# Altium footprint library lib_datalogger.PcbLib: 866 footprints (part 27 of 55)
Each footprint in its own frame and in the unit in brackets; x right, y up, seen from the top. Pads: shape width x height; smd on the part's side, far side on the other; paste and mask are expansions set on the pad; w line width, h text height; cw(c..) or ccw(c..) is an arc to the next point about the centre after c.
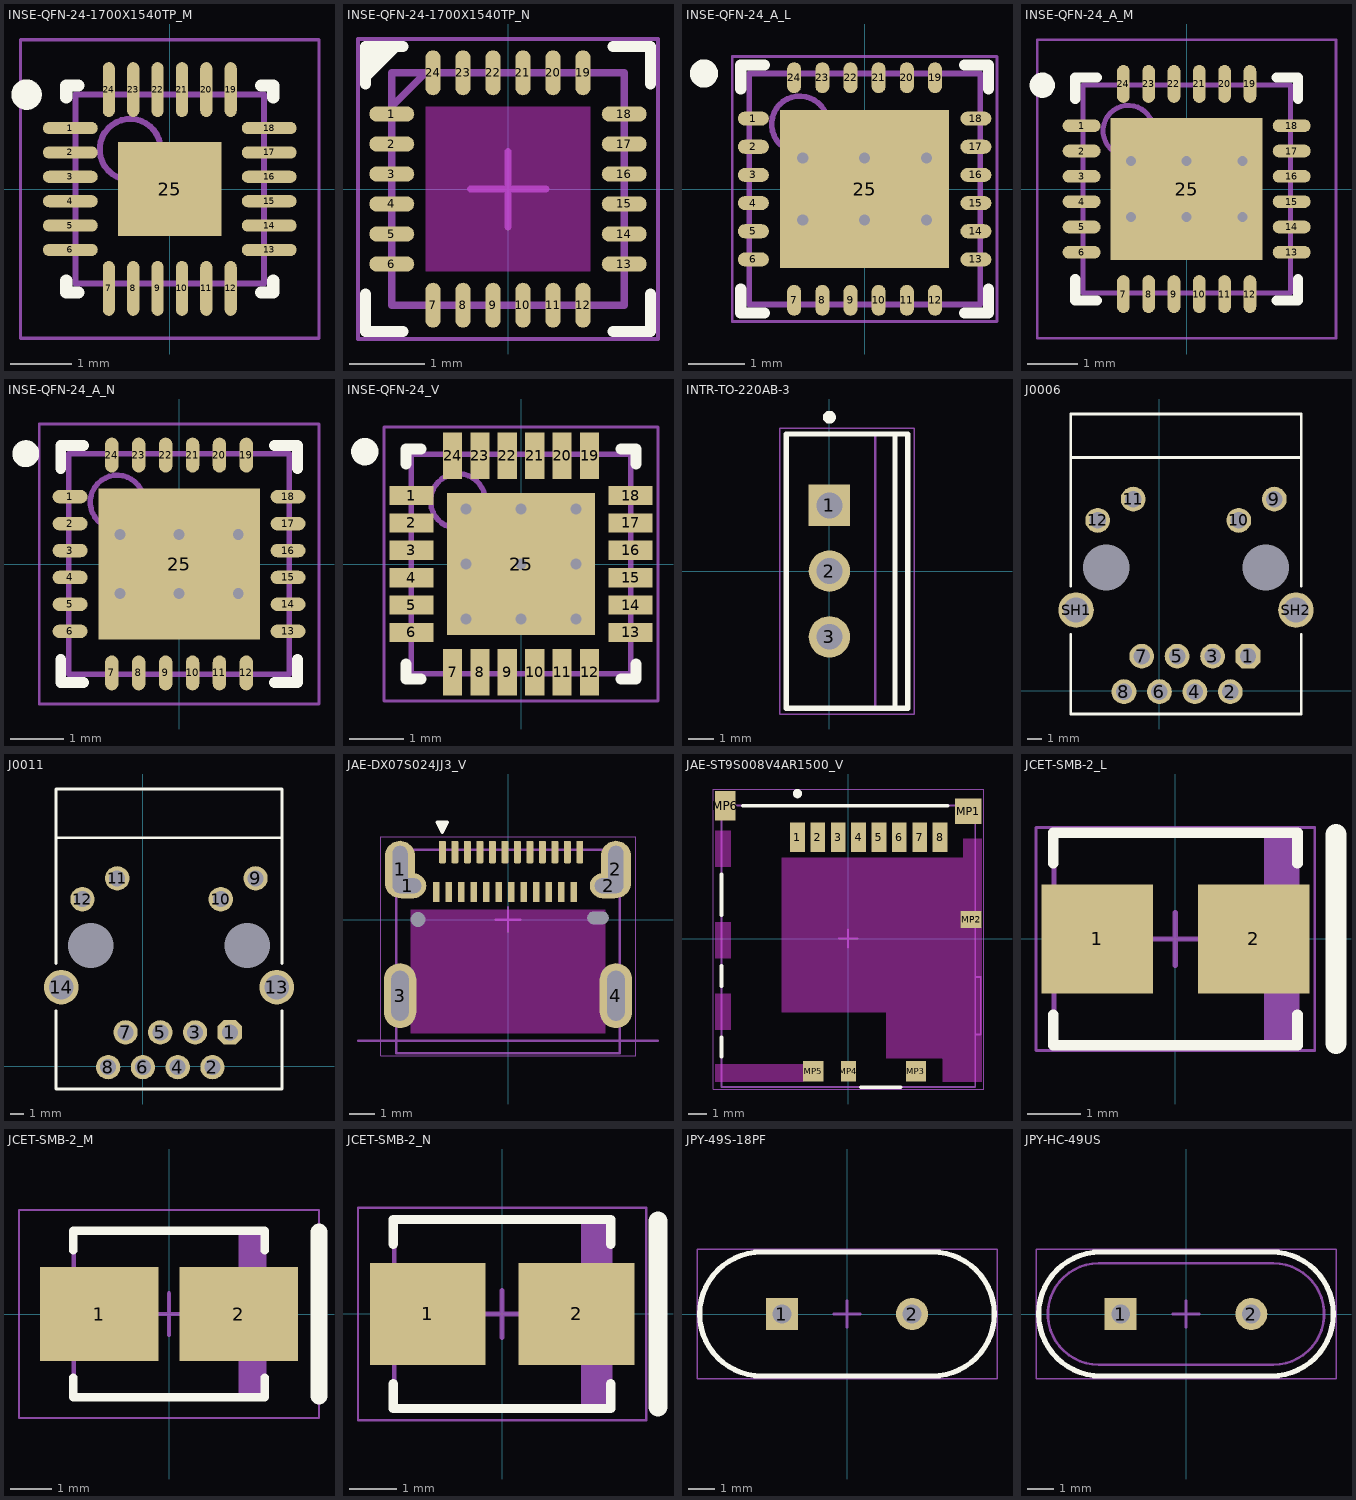
[diagram p26: the footprints below, top view; thin cyan lines are the x and y axes]

## INSE-QFN-24-1700X1540TP_M [mm] "QFN, 24-Leads, Body 3.1x3.1mm, Pitch 0.40mm, Thermal Pad 1.54x1.70mm, IPC Low Density"
height 1.05
pads (25):
  oval 0.9x0.2 smd: 1(-1.632,1) 2(-1.632,0.6) 3(-1.632,0.2) 4(-1.632,-0.2) 5(-1.632,-0.6) 6(-1.632,-1) 13(1.632,-1) 14(1.632,-0.6) 15(1.632,-0.2) 16(1.632,0.2) 17(1.632,0.6) 18(1.632,1)
  oval 0.2x0.9 smd: 7(-1,-1.632) 8(-0.6,-1.632) 9(-0.2,-1.632) 10(0.2,-1.632) 11(0.6,-1.632) 12(1,-1.632) 19(1,1.632) 20(0.6,1.632) 21(0.2,1.632) 22(-0.2,1.632) 23(-0.6,1.632) 24(-1,1.632)
  rect 1.7x1.54 smd: 25(0,0)
Top Overlay:
  circle w0.25: c-2.35,1.55 r0.125
  lines w0.2: -1.7,-1.5 -1.7,-1.7 -1.5,-1.7 ; -1.7,1.5 -1.7,1.7 -1.5,1.7 ; 1.5,-1.7 1.7,-1.7 1.7,-1.5 ; 1.5,1.7 1.7,1.7 1.7,1.5
Mechanical 13:
  circle w0.1: c-0.65,0.65 r0.5
  lines w0.1: -1.55,-1.55 1.55,-1.55 1.55,1.55 -1.55,1.55 -1.55,-1.55
Mechanical 15:
  lines w0.05: -2.45,-2.45 2.45,-2.45 2.45,2.45 -2.45,2.45 -2.45,-2.45
  lines w0.1: -0.5,0 0.5,0 ; 0,-0.5 0,0.5
3D body "QFN40P300X300X105_HS-25L.step": height 1.05, standoff 0, extent -1.551,-1.551 1.551,1.551

## INSE-QFN-24-1700X1540TP_N [mm] "QFN, 24-Leads, Body 3.1x3.1mm, Pitch 0.40mm, Thermal Pad 1.54x1.70mm, IPC Medium Density"
height 1.05
pads (24):
  oval 0.6x0.2 smd: 1(-1.55,1) 2(-1.55,0.6) 3(-1.55,0.2) 4(-1.55,-0.2) 5(-1.55,-0.6) 6(-1.55,-1) 13(1.55,-1) 14(1.55,-0.6) 15(1.55,-0.2) 16(1.55,0.2) 17(1.55,0.6) 18(1.55,1)
  oval 0.2x0.6 smd: 7(-1,-1.55) 8(-0.6,-1.55) 9(-0.2,-1.55) 10(0.2,-1.55) 11(0.6,-1.55) 12(1,-1.55) 19(1,1.55) 20(0.6,1.55) 21(0.2,1.55) 22(-0.2,1.55) 23(-0.6,1.55) 24(-1,1.55)
Top Overlay:
  region: -1.9,1.9 -1.9,1.5 -1.5,1.9
  lines w0.15: -1.9,-1.4 -1.9,-1.9 -1.4,-1.9 ; -1.9,1.4 -1.9,1.9 -1.4,1.9 ; -1.9,1.5 -1.5,1.9 ; 1.4,-1.9 1.9,-1.9 1.9,-1.4 ; 1.4,1.9 1.9,1.9 1.9,1.4
Keep-Out Layer:
  rectangle: -1.1,-1.1 1.1,1.1
Mechanical 13:
  lines w0.1: -1.55,1.1 -1.1,1.55 ; -1.55,-1.55 -1.55,1.55 1.55,1.55 1.55,-1.55 -1.55,-1.55
Mechanical 15:
  lines w0.05: -2,-2 -2,2 2,2 2,-2 -2,-2
  lines w0.1: -0.5,0 0.5,0 ; 0,-0.5 0,0.5
Top Designator:
  text ".Designator" at -1.27,-0.127 h0.6
3D body "MPU9250.STEP": height 1.04, standoff -0.01, extent -1.51,-1.51 1.51,1.51

## INSE-QFN-24_A_L [mm] "QFN, 24-Leads, Body 4.1x4.1mm, Pitch 0.50mm, Thermal Pad 3.00x2.80mm, IPC High Density"
height 0.95
pads (25):
  oval 0.55x0.25 smd: 1(-1.975,1.25) 2(-1.975,0.75) 3(-1.975,0.25) 4(-1.975,-0.25) 5(-1.975,-0.75) 6(-1.975,-1.25) 13(1.975,-1.25) 14(1.975,-0.75) 15(1.975,-0.25) 16(1.975,0.25) 17(1.975,0.75) 18(1.975,1.25)
  oval 0.25x0.55 smd: 7(-1.25,-1.975) 8(-0.75,-1.975) 9(-0.25,-1.975) 10(0.25,-1.975) 11(0.75,-1.975) 12(1.25,-1.975) 19(1.25,1.975) 20(0.75,1.975) 21(0.25,1.975) 22(-0.25,1.975) 23(-0.75,1.975) 24(-1.25,1.975)
  rect 3x2.8 smd: 25(0,0)
via -1.1,0.55 diameter 0.5 hole 0.2
via 0,0.55 diameter 0.5 hole 0.2
via 1.1,0.55 diameter 0.5 hole 0.2
via -1.1,-0.55 diameter 0.5 hole 0.2
via 0,-0.55 diameter 0.5 hole 0.2
via 1.1,-0.55 diameter 0.5 hole 0.2
Top Overlay:
  circle w0.25: c-2.85,2.05 r0.125
  lines w0.2: -2.2,-1.775 -2.2,-2.2 -1.775,-2.2 ; -2.2,1.775 -2.2,2.2 -1.775,2.2 ; 1.775,-2.2 2.2,-2.2 2.2,-1.775 ; 1.775,2.2 2.2,2.2 2.2,1.775
Mechanical 13:
  circle w0.1: c-1.15,1.15 r0.5
  lines w0.1: -2.05,-2.05 -2.05,2.05 2.05,2.05 2.05,-2.05 -2.05,-2.05
Mechanical 15:
  lines w0.05: -2.35,-2.35 -2.35,2.35 2.35,2.35 2.35,-2.35 -2.35,-2.35
  lines w0.1: -0.5,0 0.5,0 ; 0,-0.5 0,0.5
3D body "QFN50P400X400X95_HS-25L.step": height 0.95, standoff 0, extent -2.051,-2.051 2.051,2.051

## INSE-QFN-24_A_M [mm] "QFN, 24-Leads, Body 4.1x4.1mm, Pitch 0.50mm, Thermal Pad 3.00x2.80mm, IPC Low Density"
height 0.95
pads (25):
  oval 0.75x0.25 smd: 1(-2.075,1.25) 2(-2.075,0.75) 3(-2.075,0.25) 4(-2.075,-0.25) 5(-2.075,-0.75) 6(-2.075,-1.25) 13(2.075,-1.25) 14(2.075,-0.75) 15(2.075,-0.25) 16(2.075,0.25) 17(2.075,0.75) 18(2.075,1.25)
  oval 0.25x0.75 smd: 7(-1.25,-2.075) 8(-0.75,-2.075) 9(-0.25,-2.075) 10(0.25,-2.075) 11(0.75,-2.075) 12(1.25,-2.075) 19(1.25,2.075) 20(0.75,2.075) 21(0.25,2.075) 22(-0.25,2.075) 23(-0.75,2.075) 24(-1.25,2.075)
  rect 3x2.8 smd: 25(0,0)
via 1.1,-0.55 diameter 0.5 hole 0.2
via 0,-0.55 diameter 0.5 hole 0.2
via -1.1,-0.55 diameter 0.5 hole 0.2
via 1.1,0.55 diameter 0.5 hole 0.2
via 0,0.55 diameter 0.5 hole 0.2
via -1.1,0.55 diameter 0.5 hole 0.2
Top Overlay:
  circle w0.25: c-2.85,2.05 r0.125
  lines w0.2: -2.2,-1.775 -2.2,-2.2 -1.775,-2.2 ; -2.2,1.775 -2.2,2.2 -1.775,2.2 ; 1.775,-2.2 2.2,-2.2 2.2,-1.775 ; 1.775,2.2 2.2,2.2 2.2,1.775
Mechanical 13:
  circle w0.1: c-1.15,1.15 r0.5
  lines w0.1: -2.05,-2.05 2.05,-2.05 2.05,2.05 -2.05,2.05 -2.05,-2.05
Mechanical 15:
  lines w0.05: -2.95,-2.95 2.95,-2.95 2.95,2.95 -2.95,2.95 -2.95,-2.95
  lines w0.1: -0.5,0 0.5,0 ; 0,-0.5 0,0.5
3D body "QFN50P400X400X95_HS-25M.step": height 0.95, standoff 0, extent -2.051,-2.051 2.051,2.051

## INSE-QFN-24_A_N [mm] "QFN, 24-Leads, Body 4.1x4.1mm, Pitch 0.50mm, Thermal Pad 3.00x2.80mm, IPC Medium Density"
height 0.95
pads (25):
  oval 0.65x0.25 smd: 1(-2.025,1.25) 2(-2.025,0.75) 3(-2.025,0.25) 4(-2.025,-0.25) 5(-2.025,-0.75) 6(-2.025,-1.25) 13(2.025,-1.25) 14(2.025,-0.75) 15(2.025,-0.25) 16(2.025,0.25) 17(2.025,0.75) 18(2.025,1.25)
  oval 0.25x0.65 smd: 7(-1.25,-2.025) 8(-0.75,-2.025) 9(-0.25,-2.025) 10(0.25,-2.025) 11(0.75,-2.025) 12(1.25,-2.025) 19(1.25,2.025) 20(0.75,2.025) 21(0.25,2.025) 22(-0.25,2.025) 23(-0.75,2.025) 24(-1.25,2.025)
  rect 3x2.8 smd: 25(0,0)
via 1.1,-0.55 diameter 0.5 hole 0.2
via 0,-0.55 diameter 0.5 hole 0.2
via -1.1,-0.55 diameter 0.5 hole 0.2
via 1.1,0.55 diameter 0.5 hole 0.2
via 0,0.55 diameter 0.5 hole 0.2
via -1.1,0.55 diameter 0.5 hole 0.2
Top Overlay:
  circle w0.25: c-2.85,2.05 r0.125
  lines w0.2: -2.2,-1.775 -2.2,-2.2 -1.775,-2.2 ; -2.2,1.775 -2.2,2.2 -1.775,2.2 ; 1.775,-2.2 2.2,-2.2 2.2,-1.775 ; 1.775,2.2 2.2,2.2 2.2,1.775
Mechanical 13:
  circle w0.1: c-1.15,1.15 r0.5
  lines w0.1: -2.05,-2.05 2.05,-2.05 2.05,2.05 -2.05,2.05 -2.05,-2.05
Mechanical 15:
  lines w0.05: -2.6,-2.6 2.6,-2.6 2.6,2.6 -2.6,2.6 -2.6,-2.6
  lines w0.1: -0.5,0 0.5,0 ; 0,-0.5 0,0.5
3D body "QFN50P400X400X95_HS-25N.step": height 0.95, standoff 0, extent -2.051,-2.051 2.051,2.051

## INSE-QFN-24_V [mm] "QFN, 24-Leads, Body 4.00x4.00mm, Pitch 0.50mm, Thermal Pad 2.7x2.6mm"
height 0.95
pads (25):
  rect 0.8x0.35 smd: 1(-2,1.25) 2(-2,0.75) 3(-2,0.25) 4(-2,-0.25) 5(-2,-0.75) 6(-2,-1.25) 13(2,-1.25) 14(2,-0.75) 15(2,-0.25) 16(2,0.25) 17(2,0.75) 18(2,1.25)
  rect 0.35x0.85 smd: 7(-1.25,-1.975) 8(-0.75,-1.975) 9(-0.25,-1.975) 10(0.25,-1.975) 11(0.75,-1.975) 12(1.25,-1.975) 19(1.25,1.975) 20(0.75,1.975) 21(0.25,1.975) 22(-0.25,1.975) 23(-0.75,1.975) 24(-1.25,1.975)
  rect 2.7x2.6 smd: 25(0,0)
via -1,1 diameter 0.5 hole 0.2
via 0,1 diameter 0.5 hole 0.2
via 1,1 diameter 0.5 hole 0.2
via -1,0 diameter 0.5 hole 0.2
via 0,0 diameter 0.5 hole 0.2
via 1,0 diameter 0.5 hole 0.2
via -1,-1 diameter 0.5 hole 0.2
via 0,-1 diameter 0.5 hole 0.2
via 1,-1 diameter 0.5 hole 0.2
Top Overlay:
  circle w0.25: c-2.85,2.05 r0.125
  lines w0.2: -2.1,-1.825 -2.1,-2.1 -1.825,-2.1 ; -2.1,1.825 -2.1,2.1 -1.825,2.1 ; 1.825,-2.1 2.1,-2.1 2.1,-1.825 ; 1.825,2.1 2.1,2.1 2.1,1.825
Mechanical 13:
  circle w0.1: c-1.15,1.15 r0.5
  lines w0.1: -2,-2 -2,2 2,2 2,-2 -2,-2
Mechanical 15:
  lines w0.05: -2.5,-2.5 2.5,-2.5 2.5,2.5 -2.5,2.5 -2.5,-2.5
  lines w0.1: -0.5,0 0.5,0 ; 0,-0.5 0,0.5
3D body: height 0.95, standoff 0, extent -2,-2 2,2

## INTR-TO-220AB-3 [mm] "FM, 3-Leads, Body 10.55x4.7mm, Pitch 2.54mm"
height 19.3
pads (3):
  rect 1.6x1.6 hole 1: 1(0,2.54)
  round 1.6 hole 1: 2(0,0) 3(0,-2.54)
Top Overlay:
  circle w0.25: c0,5.95 r0.125
  lines w0.2: 2.53,-5.3 2.53,5.3 ; -1.67,-5.3 3.03,-5.3 3.03,5.3 -1.67,5.3 -1.67,-5.3
Mechanical 13:
  lines w0.1: 1.78,-5.275 1.78,5.275 ; -1.67,-5.275 -1.67,5.275 3.03,5.275 3.03,-5.275 -1.67,-5.275
Mechanical 15:
  lines w0.05: -1.92,-5.525 -1.92,5.525 3.28,5.525 3.28,-5.525 -1.92,-5.525
  lines w0.1: -0.5,0 0.5,0 ; 0,-0.5 0,0.5
3D body: height 3.55, standoff 0, extent -0.255,1.9 0.255,3.18
3D body: height 0, standoff -1.6, extent -0.255,2.135 0.255,2.945
3D body: height 3.55, standoff 0, extent -0.255,-0.64 0.255,0.64
3D body: height 0, standoff -1.6, extent -0.255,-0.405 0.255,0.405
3D body: height 3.55, standoff 0, extent -0.255,-3.18 0.255,-1.9
3D body: height 0, standoff -1.6, extent -0.255,-2.945 0.255,-2.135
3D body: height 13, standoff 3.55, extent -1.67,-5.275 3.03,5.275
3D body: height 14.73, standoff 13, extent 1.78,-5.2 3.03,5.2
3D body: height 14.77, standoff 14.73, extent 1.78,0.356 3.03,5.2
3D body: height 14.77, standoff 14.73, extent 1.78,-5.2 3.03,-0.356
3D body: height 18.38, standoff 18.34, extent 1.78,0.356 3.03,5.2
3D body: height 18.38, standoff 18.34, extent 1.78,-5.2 3.03,-0.356
3D body: height 14.87, standoff 14.76, extent 1.78,0.698 3.03,5.2
3D body: height 14.87, standoff 14.76, extent 1.78,-5.2 3.03,-0.698
3D body: height 18.34, standoff 18.24, extent 1.78,0.698 3.03,5.2
3D body: height 18.34, standoff 18.24, extent 1.78,-5.2 3.03,-0.698
3D body: height 15.04, standoff 14.86, extent 1.78,1.014 3.03,5.2
3D body: height 15.04, standoff 14.86, extent 1.78,-5.2 3.03,-1.014
3D body: height 18.24, standoff 18.07, extent 1.78,1.014 3.03,5.2
3D body: height 18.24, standoff 18.07, extent 1.78,-5.2 3.03,-1.014
3D body: height 15.26, standoff 15.03, extent 1.78,1.29 3.03,5.2
3D body: height 15.26, standoff 15.03, extent 1.78,-5.2 3.03,-1.29
3D body: height 18.07, standoff 17.84, extent 1.78,1.29 3.03,5.2
3D body: height 18.07, standoff 17.84, extent 1.78,-5.2 3.03,-1.29
3D body: height 15.54, standoff 15.26, extent 1.78,1.517 3.03,5.2
3D body: height 15.54, standoff 15.26, extent 1.78,-5.2 3.03,-1.517
3D body: height 17.85, standoff 17.56, extent 1.78,1.517 3.03,5.2
3D body: height 17.85, standoff 17.56, extent 1.78,-5.2 3.03,-1.517
3D body: height 15.86, standoff 15.54, extent 1.78,1.686 3.03,5.2
3D body: height 15.86, standoff 15.54, extent 1.78,-5.2 3.03,-1.686
3D body: height 17.57, standoff 17.25, extent 1.78,1.686 3.03,5.2
3D body: height 17.57, standoff 17.25, extent 1.78,-5.2 3.03,-1.686
3D body: height 16.2, standoff 15.85, extent 1.78,1.79 3.03,5.2
3D body: height 16.2, standoff 15.85, extent 1.78,-5.2 3.03,-1.79
3D body: height 17.25, standoff 16.91, extent 1.78,1.79 3.03,5.2
3D body: height 17.25, standoff 16.91, extent 1.78,-5.2 3.03,-1.79
3D body: height 16.55, standoff 16.19, extent 1.78,1.825 3.03,5.2
3D body: height 16.55, standoff 16.19, extent 1.78,-5.2 3.03,-1.825
3D body: height 16.91, standoff 16.55, extent 1.78,1.825 3.03,5.2
3D body: height 16.91, standoff 16.55, extent 1.78,-5.2 3.03,-1.825
3D body: height 19.3, standoff 18.38, extent 1.78,-5.2 3.03,5.2

## J0006 [mil]
pads (16):
  oct 70x70 hole 46: 1(250,98)
  round 70 hole 46: 2(200,-2) 3(150,98) 4(100,-2) 5(50,98) 6(0,-2) 7(-50,98) 8(-100,-2) 9(324,541) 10(224,481) 11(-74,541) 12(-174,481)
  round 0 hole 130 unplated: MH1(-150,348) MH2(300,348)
  round 100 hole 70: SH1(-235,228) SH2(385,228)
Top Overlay:
  lines w7.87: -250,160.13 -250,-65 400,-65 400,160.13 ; -250,295.87 -250,781 400,781 400,295.87 ; -250,658 400,658
3D body "RJ45-01-J0011D01BNL.STEP": height 534.38, standoff -155.12, extent -251.77,-61.83 401.77,778.58

## J0011 [mil]
pads (16):
  oct 70x70 hole 46: 1(250,98)
  round 70 hole 46: 2(200,-2) 3(150,98) 4(100,-2) 5(50,98) 6(0,-2) 7(-50,98) 8(-100,-2) 9(324,541) 10(224,481) 11(-74,541) 12(-174,481)
  round 100 hole 70: 13(385,228) 14(-235,228)
  round 0 hole 130 unplated: MH1(300,348) MH2(-150,348)
Top Overlay:
  lines w7.87: -250,160.13 -250,-65 400,-65 400,160.13 ; -250,295.87 -250,798 400,798 400,295.87 ; -250,658 400,658
3D body "User Library-RMS-001L-08A0-GY.STEP": height 570.87, standoff -90.55, extent -239.96,-60 389.96,778.58

## JAE-DX07S024JJ3_V [mm] "THD, 24-Leads, Body 8.17x8.94mm, Pitch 0.5mm"
height 3.29
pads (32):
  oval 1.2x2.3 hole 0.6 slot 1.9 at 90 deg: 1(-4.32,2) 2(4.32,2)
  oval 1.5x1 hole 0.6 slot 1.1 at 0 deg: 1(-4.02,1.35) 2(4.02,1.35)
  oval 1.3x2.6 hole 0.7 slot 2 at 90 deg: 3(-4.32,-3.05) 4(4.32,-3.05)
  rrect25% 0.27x0.9 smd: A1(-2.625,2.7) A2(-2.125,2.7) A3(-1.625,2.7) A4(-1.125,2.7) A5(-0.625,2.7) A6(-0.125,2.7) A7(0.375,2.7) A8(0.875,2.7) A9(1.375,2.7) A10(1.875,2.7) A11(2.375,2.7) A12(2.875,2.7)
  rrect25% 0.27x0.8 smd: B1(2.625,1.1) B2(2.125,1.1) B3(1.625,1.1) B4(1.125,1.1) B5(0.625,1.1) B6(0.125,1.1) B7(-0.375,1.1) B8(-0.875,1.1) B9(-1.375,1.1) B10(-1.875,1.1) B11(-2.375,1.1) B12(-2.875,1.1)
  round 0 hole 0.6 unplated: H1(-3.6,0)
  round 0 hole 0.5 slot 0.85 at 0 deg unplated: H2(3.6,0.065)
Top Layer keep-out:
  region: -3.9,-4.55 3.9,-4.55 3.9,0.4 -3.9,0.4
Top Overlay:
  region: -2.825,3.89 -2.425,3.89 -2.625,3.49
  lines w0.15: -2.825,3.89 -2.625,3.49 -2.425,3.89 -2.825,3.89
Mechanical 13:
  lines w0.1: -6,-4.85 6,-4.85 ; -4.47,-5.35 -4.47,2.8 4.47,2.8 4.47,-5.35 -4.47,-5.35
Mechanical 15:
  lines w0.05: -5.1,-5.45 -5.1,3.3 5.1,3.3 5.1,-5.45 -5.1,-5.45
  lines w0.1: -0.5,0 0.5,0 ; 0,-0.5 0,0.5
Top 3D Body:
  text "Board Edge" at -1.1,-5.3 h0.5
Top Designator:
  text ".Designator" at -1.905,1.778 h0.6
3D body "CX90B1-24P_4800497000_3D.stp": height 3.16, standoff -0.6, extent -4.47,-5.35 4.47,2.8

## JAE-ST9S008V4AR1500_V [mm] "SD Card, 8-Leads, Body 15.2x13.7mm, Pitch 1.1mm"
height 1.55
pads (14):
  rect 0.8x1.6 smd: 1(-2.737,5.475) 2(-1.637,5.475) 3(-0.537,5.475) 4(0.563,5.475) 5(1.663,5.475) 6(2.763,5.475) 7(3.863,5.475) 8(4.963,5.475)
  rect 1.45x1.4 smd: MP1(6.488,6.875)
  rect 1.15x0.9 smd: MP2(6.638,1.025)
  rect 1.1x1.1 smd: MP3(3.663,-7.175) MP5(-1.887,-7.175)
  rect 0.8x1.1 smd: MP4(0.013,-7.175)
  rect 1.1x1.6 smd: MP6(-6.637,7.175)
Top Overlay:
  circle w0.25: c-2.737,7.825 r0.125
  lines w0.2: -6.837,-5.325 -6.837,-6.375 ; -6.837,-2.575 -6.837,-1.475 ; -6.837,1.275 -6.837,3.475 ; -5.687,7.175 5.363,7.175 ; 0.677,-8.025 2.848,-8.025
Keep-Out Layer:
  region: -3.587,4.375 -3.587,-3.975 2.063,-3.975 2.063,-6.475 5.113,-6.475 5.113,-7.725 7.213,-7.725 7.213,0.575 6.063,0.575 6.063,1.475 7.213,1.475 7.213,5.375 6.213,5.375 6.213,4.375
  region: -6.337,-4.925 -7.187,-4.925 -7.187,-2.975 -6.337,-2.975
  region: -2.437,-7.725 -2.437,-6.775 -7.187,-6.775 -7.187,-7.725
  region: -6.337,-1.075 -7.187,-1.075 -7.187,0.875 -6.337,0.875
  region: -6.337,3.875 -7.187,3.875 -7.187,5.825 -6.337,5.825
Mechanical 13:
  lines w0.1: 6.863,-5.225 6.863,-8.025 ; 6.863,-5.175 7.163,-5.175 7.163,-2.075 6.863,-2.075 6.863,-8.025 ; 6.863,-8.025 -6.837,-8.025 -6.837,7.175 6.863,7.175 6.863,-8.025
Mechanical 15:
  lines w0.05: -7.287,-8.125 -7.287,8.075 7.313,8.075 7.313,-8.125 -7.287,-8.125
  lines w0.1: -0.5,0 0.5,0 ; 0,-0.5 0,0.5
3D body: height 1.55, standoff 0, extent -6.837,-8.025 6.863,7.175
3D body: height 0.6, standoff 0, extent 6.863,-5.175 7.163,-2.075

## JCET-SMB-2_L [mm] "Molded Diode, 2-Leads, Body 4.57x3.94mm"
height 2.44
pads (2):
  rect 2.1x2.05 smd: 1(-1.475,0) 2(1.475,0)
Top Overlay:
  lines w0.2: -2.3,-1.425 -2.3,-2 2.3,-2 2.3,-1.425 ; -2.3,1.425 -2.3,2 2.3,2 2.3,1.425
  lines w0.4: 3.025,-1.97 3.025,1.97
Mechanical 13:
  rectangle: 1.67,-1.97 2.285,1.97
  lines w0.1: -2.285,-1.97 -2.285,1.97 2.285,1.97 2.285,-1.97 -2.285,-1.97
Mechanical 15:
  lines w0.05: -2.625,-2.1 -2.625,2.1 2.625,2.1 2.625,-2.1 -2.625,-2.1
  lines w0.1: -0.5,0 0.5,0 ; 0,-0.5 0,0.5
3D body "DIOM4336X24L.step": height 2.44, standoff 0, extent -2.505,-1.97 2.505,1.97

## JCET-SMB-2_M [mm] "Molded Diode, 2-Leads, Body 4.57x3.94mm"
height 2.44
pads (2):
  rect 2.85x2.25 smd: 1(-1.675,0) 2(1.675,0)
Top Overlay:
  lines w0.2: -2.3,-1.525 -2.3,-2 2.3,-2 2.3,-1.525 ; -2.3,1.525 -2.3,2 2.3,2 2.3,1.525
  lines w0.4: 3.6,-1.97 3.6,1.97
Mechanical 13:
  rectangle: 1.67,-1.97 2.285,1.97
  lines w0.1: -2.285,-1.97 -2.285,1.97 2.285,1.97 2.285,-1.97 -2.285,-1.97
Mechanical 15:
  lines w0.05: -3.6,-2.5 -3.6,2.5 3.6,2.5 3.6,-2.5 -3.6,-2.5
  lines w0.1: -0.5,0 0.5,0 ; 0,-0.5 0,0.5
3D body "DIOM4336X24M.step": height 2.44, standoff 0, extent -2.505,-1.97 2.505,1.97

## JCET-SMB-2_N [mm] "Molded Diode, 2-Leads, Body 4.57x3.94mm"
height 2.44
pads (2):
  rect 2.45x2.15 smd: 1(-1.575,0) 2(1.575,0)
Top Overlay:
  lines w0.2: -2.3,-1.475 -2.3,-2 2.3,-2 2.3,-1.475 ; -2.3,1.475 -2.3,2 2.3,2 2.3,1.475
  lines w0.4: 3.3,-1.97 3.3,1.97
Mechanical 13:
  rectangle: 1.67,-1.97 2.285,1.97
  lines w0.1: -2.285,-1.97 -2.285,1.97 2.285,1.97 2.285,-1.97 -2.285,-1.97
Mechanical 15:
  lines w0.05: -3.05,-2.25 -3.05,2.25 3.05,2.25 3.05,-2.25 -3.05,-2.25
  lines w0.1: -0.5,0 0.5,0 ; 0,-0.5 0,0.5
3D body "DIOM4336X24N.step": height 2.44, standoff 0, extent -2.505,-1.97 2.505,1.97

## JPY-49S-18PF [mm] "THD, 2-Leads, Body 11.05x4.65mm, Pitch 4.88mm"
height 3.5
pads (2):
  rect 1.2x1.2 hole 0.7: 1(-2.44,0)
  round 1.2 hole 0.7: 2(2.44,0)
Top Overlay:
  lines w0.2: -3.2,-2.325 cw(c-3.2,0) -3.2,2.325 3.2,2.325 cw(c3.2,0) 3.2,-2.325 -3.2,-2.325
Mechanical 13:
  lines w0.1: -3.2,-2.325 cw(c-3.2,0) -3.2,2.325 3.2,2.325 cw(c3.2,0) 3.2,-2.325 -3.2,-2.325
Mechanical 15:
  lines w0.05: -5.625,-2.425 5.625,-2.425 5.625,2.425 -5.625,2.425 -5.625,-2.425
  lines w0.1: -0.5,0 0.5,0 ; 0,-0.5 0,0.5
3D body: height 3.5, standoff 0, extent -5.525,-2.325 5.525,2.325
3D body: height 0, standoff -12.7, extent -2.663,-0.224 -2.215,0.225
3D body: height 0, standoff -12.7, extent 2.217,-0.224 2.665,0.225

## JPY-HC-49US [mm] "THD, 2-Leads, Body 11.05x4.65mm, Pitch 4.9mm"
height 3.5
pads (2):
  rect 1.2x1.2 hole 0.7: 1(-2.45,0)
  round 1.2 hole 0.7: 2(2.45,0)
Top Overlay:
  lines w0.2: -3.2,-2.325 cw(c-3.2,0) -3.2,2.325 3.2,2.325 cw(c3.2,0) 3.2,-2.325 -3.2,-2.325
Mechanical 13:
  lines w0.1: -3.277,-1.9 cw(c-3.277,0) -3.277,1.9 3.277,1.9 cw(c3.277,0) 3.277,-1.9 -3.277,-1.9 ; -3.2,-2.325 cw(c-3.2,0) -3.2,2.325 3.2,2.325 cw(c3.2,0) 3.2,-2.325 -3.2,-2.325
Mechanical 15:
  lines w0.05: -5.625,-2.425 -5.625,2.425 5.625,2.425 5.625,-2.425 -5.625,-2.425
  lines w0.1: -0.5,0 0.5,0 ; 0,-0.5 0,0.5
3D body: height 0, standoff -13.5, extent -2.673,-0.224 -2.225,0.225
3D body: height 0, standoff -13.5, extent 2.227,-0.224 2.675,0.225
3D body: height 3.5, standoff 0, extent -5.177,-1.901 5.177,1.901
3D body: height 1, standoff 0, extent -5.525,-2.325 5.525,2.325